# Altium schematic symbol library jlcpcb_2025_04_capacitors_extended_1206.schlib: 2503 symbols (part 6 of 14) (continued)
## CC1206JKNPOCBN471
designator C?  Capacitance: 470pF  (hidden comment: *)
Capacitor, Ceramic (MLCC), 470pF, ±5%, 1kV, NP0, ±5%, SMD 1206; Manufacturer: YAGEO; Manufacturer Part Number: CC1206JKNPOCBN471; Package Size: 1206; JLCPCB Basic Part: No; JLCPCB Part Number: C107177; Supplier 1: LCSC; Category: Capacitors - MLCC; Supplier Part Number 1: C107177; Tolerance: ±5%; Voltage Rating: 1kV; Temperature Coefficient: NP0; RoHS: Yes; ComponentLink1Description: Datasheet; ComponentLink1URL: https://wmsc.lcsc.com/wmsc/upload/file/pdf/v2/lcsc/2304140030_YAGEO-CC1206JKNPOCBN471_C107177.pdf; ComponentLink2Description: JLCPCB Part URL; ComponentLink2URL: https://jlcpcb.com/partdetail/C107177; ComponentLink3Description: LCSC Part URL; ComponentLink3URL: https://lcsc.com/product-detail/Multilayer-Ceramic-Capacitors-MLCC---SMD-SMT_YAGEO-YAGEO-CC1206JKNPOCBN471_C107177.html
footprint CAP-1206 (1206 (3216M) Capacitor)
pins: 1, 2

## CC1206JKNPOCBN560
designator C?  Capacitance: 56pF  (hidden comment: *)
Capacitor, Ceramic (MLCC), 56pF, ±5%, 1kV, NP0, ±5%, SMD 1206; Manufacturer: YAGEO; Manufacturer Part Number: CC1206JKNPOCBN560; Package Size: 1206; JLCPCB Basic Part: No; JLCPCB Part Number: C113875; Supplier 1: LCSC; Category: Capacitors - MLCC; Supplier Part Number 1: C113875; Tolerance: ±5%; Voltage Rating: 1kV; Temperature Coefficient: NP0; RoHS: Yes; ComponentLink1Description: Datasheet; ComponentLink1URL: https://wmsc.lcsc.com/wmsc/upload/file/pdf/v2/lcsc/2304140030_YAGEO-CC1206JKNPOCBN560_C113875.pdf; ComponentLink2Description: JLCPCB Part URL; ComponentLink2URL: https://jlcpcb.com/partdetail/C113875; ComponentLink3Description: LCSC Part URL; ComponentLink3URL: https://lcsc.com/product-detail/Multilayer-Ceramic-Capacitors-MLCC---SMD-SMT_YAGEO-YAGEO-CC1206JKNPOCBN560_C113875.html
footprint CAP-1206 (1206 (3216M) Capacitor)
pins: 1, 2

## CC1206JKNPOCBN561
designator C?  Capacitance: 560pF  (hidden comment: *)
Capacitor, Ceramic (MLCC), 560pF, ±5%, 1kV, NP0, ±5%, SMD 1206; Manufacturer: YAGEO; Manufacturer Part Number: CC1206JKNPOCBN561; Package Size: 1206; JLCPCB Basic Part: No; JLCPCB Part Number: C541496; Supplier 1: LCSC; Category: Capacitors - MLCC; Supplier Part Number 1: C541496; Tolerance: ±5%; Voltage Rating: 1kV; Temperature Coefficient: NP0; RoHS: Yes; ComponentLink1Description: Datasheet; ComponentLink1URL: https://wmsc.lcsc.com/wmsc/upload/file/pdf/v2/lcsc/2006151141_YAGEO-CC1206JKNPOCBN561_C541496.pdf; ComponentLink2Description: JLCPCB Part URL; ComponentLink2URL: https://jlcpcb.com/partdetail/C541496; ComponentLink3Description: LCSC Part URL; ComponentLink3URL: https://lcsc.com/product-detail/Multilayer-Ceramic-Capacitors-MLCC---SMD-SMT_YAGEO-YAGEO-CC1206JKNPOCBN561_C541496.html
footprint CAP-1206 (1206 (3216M) Capacitor)
pins: 1, 2

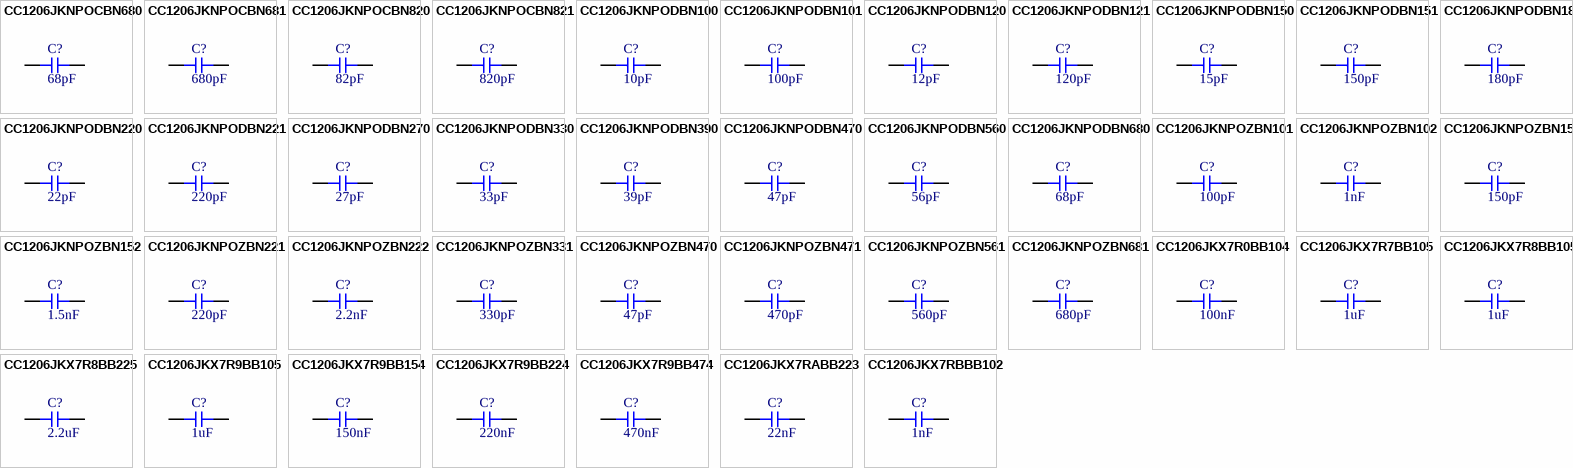
[diagram p25: symbols CC1206JKNPOCBN680 to CC1206JKX7RBBB102]

## CC1206JKNPOCBN680
designator C?  Capacitance: 68pF  (hidden comment: *)
Capacitor, Ceramic (MLCC), 68pF, ±5%, 1kV, NP0, ±5%, SMD 1206; Manufacturer: YAGEO; Manufacturer Part Number: CC1206JKNPOCBN680; Package Size: 1206; JLCPCB Basic Part: No; JLCPCB Part Number: C107178; Supplier 1: LCSC; Category: Capacitors - MLCC; Supplier Part Number 1: C107178; Tolerance: ±5%; Voltage Rating: 1kV; Temperature Coefficient: NP0; RoHS: Yes; ComponentLink1Description: Datasheet; ComponentLink1URL: https://wmsc.lcsc.com/wmsc/upload/file/pdf/v2/lcsc/2304140030_YAGEO-CC1206JKNPOCBN680_C107178.pdf; ComponentLink2Description: JLCPCB Part URL; ComponentLink2URL: https://jlcpcb.com/partdetail/C107178; ComponentLink3Description: LCSC Part URL; ComponentLink3URL: https://lcsc.com/product-detail/Multilayer-Ceramic-Capacitors-MLCC---SMD-SMT_YAGEO-YAGEO-CC1206JKNPOCBN680_C107178.html
footprint CAP-1206 (1206 (3216M) Capacitor)
pins: 1, 2

## CC1206JKNPOCBN681
designator C?  Capacitance: 680pF  (hidden comment: *)
Capacitor, Ceramic (MLCC), 680pF, ±5%, 1kV, NP0, ±5%, SMD 1206; Manufacturer: YAGEO; Manufacturer Part Number: CC1206JKNPOCBN681; Package Size: 1206; JLCPCB Basic Part: No; JLCPCB Part Number: C541497; Supplier 1: LCSC; Category: Capacitors - MLCC; Supplier Part Number 1: C541497; Tolerance: ±5%; Voltage Rating: 1kV; Temperature Coefficient: NP0; RoHS: Yes; ComponentLink1Description: Datasheet; ComponentLink1URL: https://wmsc.lcsc.com/wmsc/upload/file/pdf/v2/lcsc/2006151141_YAGEO-CC1206JKNPOCBN681_C541497.pdf; ComponentLink2Description: JLCPCB Part URL; ComponentLink2URL: https://jlcpcb.com/partdetail/C541497; ComponentLink3Description: LCSC Part URL; ComponentLink3URL: https://lcsc.com/product-detail/Multilayer-Ceramic-Capacitors-MLCC---SMD-SMT_YAGEO-YAGEO-CC1206JKNPOCBN681_C541497.html
footprint CAP-1206 (1206 (3216M) Capacitor)
pins: 1, 2

## CC1206JKNPOCBN820
designator C?  Capacitance: 82pF  (hidden comment: *)
Capacitor, Ceramic (MLCC), 82pF, ±5%, 1kV, NP0, ±5%, SMD 1206; Manufacturer: YAGEO; Manufacturer Part Number: CC1206JKNPOCBN820; Package Size: 1206; JLCPCB Basic Part: No; JLCPCB Part Number: C513610; Supplier 1: LCSC; Category: Capacitors - MLCC; Supplier Part Number 1: C513610; Tolerance: ±5%; Voltage Rating: 1kV; Temperature Coefficient: NP0; RoHS: Yes; ComponentLink1Description: Datasheet; ComponentLink1URL: https://wmsc.lcsc.com/wmsc/upload/file/pdf/v2/lcsc/2005142148_YAGEO-CC1206JKNPOCBN820_C513610.pdf; ComponentLink2Description: JLCPCB Part URL; ComponentLink2URL: https://jlcpcb.com/partdetail/C513610; ComponentLink3Description: LCSC Part URL; ComponentLink3URL: https://lcsc.com/product-detail/Multilayer-Ceramic-Capacitors-MLCC---SMD-SMT_YAGEO-YAGEO-CC1206JKNPOCBN820_C513610.html
footprint CAP-1206 (1206 (3216M) Capacitor)
pins: 1, 2

## CC1206JKNPOCBN821
designator C?  Capacitance: 820pF  (hidden comment: *)
Capacitor, Ceramic (MLCC), 820pF, ±5%, 1kV, NP0, ±5%, SMD 1206; Manufacturer: YAGEO; Manufacturer Part Number: CC1206JKNPOCBN821; Package Size: 1206; JLCPCB Basic Part: No; JLCPCB Part Number: C527262; Supplier 1: LCSC; Category: Capacitors - MLCC; Supplier Part Number 1: C527262; Tolerance: ±5%; Voltage Rating: 1kV; Temperature Coefficient: NP0; RoHS: Yes; ComponentLink1Description: Datasheet; ComponentLink1URL: https://wmsc.lcsc.com/wmsc/upload/file/pdf/v2/lcsc/2005222142_YAGEO-CC1206JKNPOCBN821_C527262.pdf; ComponentLink2Description: JLCPCB Part URL; ComponentLink2URL: https://jlcpcb.com/partdetail/C527262; ComponentLink3Description: LCSC Part URL; ComponentLink3URL: https://lcsc.com/product-detail/Multilayer-Ceramic-Capacitors-MLCC---SMD-SMT_YAGEO-YAGEO-CC1206JKNPOCBN821_C527262.html
footprint CAP-1206 (1206 (3216M) Capacitor)
pins: 1, 2

## CC1206JKNPODBN100
designator C?  Capacitance: 10pF  (hidden comment: *)
Capacitor, Ceramic (MLCC), 10pF, ±5%, 2kV, NP0, ±5%, SMD 1206; Manufacturer: YAGEO; Manufacturer Part Number: CC1206JKNPODBN100; Package Size: 1206; JLCPCB Basic Part: No; JLCPCB Part Number: C272882; Supplier 1: LCSC; Category: Capacitors - MLCC; Supplier Part Number 1: C272882; Tolerance: ±5%; Voltage Rating: 2kV; Temperature Coefficient: NP0; RoHS: Yes; ComponentLink1Description: Datasheet; ComponentLink1URL: https://wmsc.lcsc.com/wmsc/upload/file/pdf/v2/lcsc/2304140030_YAGEO-CC1206JKNPODBN100_C272882.pdf; ComponentLink2Description: JLCPCB Part URL; ComponentLink2URL: https://jlcpcb.com/partdetail/C272882; ComponentLink3Description: LCSC Part URL; ComponentLink3URL: https://lcsc.com/product-detail/Multilayer-Ceramic-Capacitors-MLCC---SMD-SMT_YAGEO-YAGEO-CC1206JKNPODBN100_C272882.html
footprint CAP-1206 (1206 (3216M) Capacitor)
pins: 1, 2

## CC1206JKNPODBN101
designator C?  Capacitance: 100pF  (hidden comment: *)
Capacitor, Ceramic (MLCC), 100pF, ±5%, 2kV, NP0, ±5%, SMD 1206; Manufacturer: YAGEO; Manufacturer Part Number: CC1206JKNPODBN101; Package Size: 1206; JLCPCB Basic Part: No; JLCPCB Part Number: C113876; Supplier 1: LCSC; Category: Capacitors - MLCC; Supplier Part Number 1: C113876; Tolerance: ±5%; Voltage Rating: 2kV; Temperature Coefficient: NP0; RoHS: Yes; ComponentLink1Description: Datasheet; ComponentLink1URL: https://wmsc.lcsc.com/wmsc/upload/file/pdf/v2/lcsc/2304140030_YAGEO-CC1206JKNPODBN101_C113876.pdf; ComponentLink2Description: JLCPCB Part URL; ComponentLink2URL: https://jlcpcb.com/partdetail/C113876; ComponentLink3Description: LCSC Part URL; ComponentLink3URL: https://lcsc.com/product-detail/Multilayer-Ceramic-Capacitors-MLCC---SMD-SMT_YAGEO-YAGEO-CC1206JKNPODBN101_C113876.html
footprint CAP-1206 (1206 (3216M) Capacitor)
pins: 1, 2

## CC1206JKNPODBN120
designator C?  Capacitance: 12pF  (hidden comment: *)
Capacitor, Ceramic (MLCC), 12pF, ±5%, 2kV, NP0, ±5%, SMD 1206; Manufacturer: YAGEO; Manufacturer Part Number: CC1206JKNPODBN120; Package Size: 1206; JLCPCB Basic Part: No; JLCPCB Part Number: C577125; Supplier 1: LCSC; Category: Capacitors - MLCC; Supplier Part Number 1: C577125; Tolerance: ±5%; Voltage Rating: 2kV; Temperature Coefficient: NP0; RoHS: Yes; ComponentLink1Description: Datasheet; ComponentLink1URL: https://wmsc.lcsc.com/wmsc/upload/file/pdf/v2/lcsc/2302141900_YAGEO-CC1206JKNPODBN120_C577125.pdf; ComponentLink2Description: JLCPCB Part URL; ComponentLink2URL: https://jlcpcb.com/partdetail/C577125; ComponentLink3Description: LCSC Part URL; ComponentLink3URL: https://lcsc.com/product-detail/Multilayer-Ceramic-Capacitors-MLCC---SMD-SMT_YAGEO-YAGEO-CC1206JKNPODBN120_C577125.html
footprint CAP-1206 (1206 (3216M) Capacitor)
pins: 1, 2

## CC1206JKNPODBN121
designator C?  Capacitance: 120pF  (hidden comment: *)
Capacitor, Ceramic (MLCC), 120pF, ±5%, 2kV, NP0, ±5%, SMD 1206; Manufacturer: YAGEO; Manufacturer Part Number: CC1206JKNPODBN121; Package Size: 1206; JLCPCB Basic Part: No; JLCPCB Part Number: C527263; Supplier 1: LCSC; Category: Capacitors - MLCC; Supplier Part Number 1: C527263; Tolerance: ±5%; Voltage Rating: 2kV; Temperature Coefficient: NP0; RoHS: Yes; ComponentLink1Description: Datasheet; ComponentLink1URL: https://wmsc.lcsc.com/wmsc/upload/file/pdf/v2/lcsc/2007091834_YAGEO-CC1206JKNPODBN121_C527263.pdf; ComponentLink2Description: JLCPCB Part URL; ComponentLink2URL: https://jlcpcb.com/partdetail/C527263; ComponentLink3Description: LCSC Part URL; ComponentLink3URL: https://lcsc.com/product-detail/Multilayer-Ceramic-Capacitors-MLCC---SMD-SMT_YAGEO-YAGEO-CC1206JKNPODBN121_C527263.html
footprint CAP-1206 (1206 (3216M) Capacitor)
pins: 1, 2

## CC1206JKNPODBN150
designator C?  Capacitance: 15pF  (hidden comment: *)
Capacitor, Ceramic (MLCC), 15pF, ±5%, 2kV, NP0, ±5%, SMD 1206; Manufacturer: YAGEO; Manufacturer Part Number: CC1206JKNPODBN150; Package Size: 1206; JLCPCB Basic Part: No; JLCPCB Part Number: C527264; Supplier 1: LCSC; Category: Capacitors - MLCC; Supplier Part Number 1: C527264; Tolerance: ±5%; Voltage Rating: 2kV; Temperature Coefficient: NP0; RoHS: Yes; ComponentLink1Description: Datasheet; ComponentLink1URL: https://wmsc.lcsc.com/wmsc/upload/file/pdf/v2/lcsc/2008061533_YAGEO-CC1206JKNPODBN150_C527264.pdf; ComponentLink2Description: JLCPCB Part URL; ComponentLink2URL: https://jlcpcb.com/partdetail/C527264; ComponentLink3Description: LCSC Part URL; ComponentLink3URL: https://lcsc.com/product-detail/Multilayer-Ceramic-Capacitors-MLCC---SMD-SMT_YAGEO-YAGEO-CC1206JKNPODBN150_C527264.html
footprint CAP-1206 (1206 (3216M) Capacitor)
pins: 1, 2

## CC1206JKNPODBN151
designator C?  Capacitance: 150pF  (hidden comment: *)
Capacitor, Ceramic (MLCC), 150pF, ±5%, 2kV, NP0, ±5%, SMD 1206; Manufacturer: YAGEO; Manufacturer Part Number: CC1206JKNPODBN151; Package Size: 1206; JLCPCB Basic Part: No; JLCPCB Part Number: C527265; Supplier 1: LCSC; Category: Capacitors - MLCC; Supplier Part Number 1: C527265; Tolerance: ±5%; Voltage Rating: 2kV; Temperature Coefficient: NP0; RoHS: Yes; ComponentLink1Description: Datasheet; ComponentLink1URL: https://wmsc.lcsc.com/wmsc/upload/file/pdf/v2/lcsc/2006031836_YAGEO-CC1206JKNPODBN151_C527265.pdf; ComponentLink2Description: JLCPCB Part URL; ComponentLink2URL: https://jlcpcb.com/partdetail/C527265; ComponentLink3Description: LCSC Part URL; ComponentLink3URL: https://lcsc.com/product-detail/Multilayer-Ceramic-Capacitors-MLCC---SMD-SMT_YAGEO-YAGEO-CC1206JKNPODBN151_C527265.html
footprint CAP-1206 (1206 (3216M) Capacitor)
pins: 1, 2

## CC1206JKNPODBN181
designator C?  Capacitance: 180pF  (hidden comment: *)
Capacitor, Ceramic (MLCC), 180pF, ±5%, 2kV, NP0, ±5%, SMD 1206; Manufacturer: YAGEO; Manufacturer Part Number: CC1206JKNPODBN181; Package Size: 1206; JLCPCB Basic Part: No; JLCPCB Part Number: C527266; Supplier 1: LCSC; Category: Capacitors - MLCC; Supplier Part Number 1: C527266; Tolerance: ±5%; Voltage Rating: 2kV; Temperature Coefficient: NP0; RoHS: Yes; ComponentLink1Description: Datasheet; ComponentLink1URL: https://wmsc.lcsc.com/wmsc/upload/file/pdf/v2/lcsc/2006241834_YAGEO-CC1206JKNPODBN181_C527266.pdf; ComponentLink2Description: JLCPCB Part URL; ComponentLink2URL: https://jlcpcb.com/partdetail/C527266; ComponentLink3Description: LCSC Part URL; ComponentLink3URL: https://lcsc.com/product-detail/Multilayer-Ceramic-Capacitors-MLCC---SMD-SMT_YAGEO-YAGEO-CC1206JKNPODBN181_C527266.html
footprint CAP-1206 (1206 (3216M) Capacitor)
pins: 1, 2

## CC1206JKNPODBN220
designator C?  Capacitance: 22pF  (hidden comment: *)
Capacitor, Ceramic (MLCC), 22pF, ±5%, 2kV, NP0, ±5%, SMD 1206; Manufacturer: YAGEO; Manufacturer Part Number: CC1206JKNPODBN220; Package Size: 1206; JLCPCB Basic Part: No; JLCPCB Part Number: C577126; Supplier 1: LCSC; Category: Capacitors - MLCC; Supplier Part Number 1: C577126; Tolerance: ±5%; Voltage Rating: 2kV; Temperature Coefficient: NP0; RoHS: Yes; ComponentLink1Description: Datasheet; ComponentLink1URL: https://wmsc.lcsc.com/wmsc/upload/file/pdf/v2/lcsc/2202221130_YAGEO-CC1206JKNPODBN220_C577126.pdf; ComponentLink2Description: JLCPCB Part URL; ComponentLink2URL: https://jlcpcb.com/partdetail/C577126; ComponentLink3Description: LCSC Part URL; ComponentLink3URL: https://lcsc.com/product-detail/Multilayer-Ceramic-Capacitors-MLCC---SMD-SMT_YAGEO-YAGEO-CC1206JKNPODBN220_C577126.html
footprint CAP-1206 (1206 (3216M) Capacitor)
pins: 1, 2

## CC1206JKNPODBN221
designator C?  Capacitance: 220pF  (hidden comment: *)
Capacitor, Ceramic (MLCC), 220pF, ±5%, 2kV, NP0, ±5%, SMD 1206; Manufacturer: YAGEO; Manufacturer Part Number: CC1206JKNPODBN221; Package Size: 1206; JLCPCB Basic Part: No; JLCPCB Part Number: C469629; Supplier 1: LCSC; Category: Capacitors - MLCC; Supplier Part Number 1: C469629; Tolerance: ±5%; Voltage Rating: 2kV; Temperature Coefficient: NP0; RoHS: Yes; ComponentLink1Description: Datasheet; ComponentLink1URL: https://wmsc.lcsc.com/wmsc/upload/file/pdf/v2/lcsc/2311211121_YAGEO-CC1206JKNPODBN221_C469629.pdf; ComponentLink2Description: JLCPCB Part URL; ComponentLink2URL: https://jlcpcb.com/partdetail/C469629; ComponentLink3Description: LCSC Part URL; ComponentLink3URL: https://lcsc.com/product-detail/Multilayer-Ceramic-Capacitors-MLCC---SMD-SMT_YAGEO-YAGEO-CC1206JKNPODBN221_C469629.html
footprint CAP-1206 (1206 (3216M) Capacitor)
pins: 1, 2

## CC1206JKNPODBN270
designator C?  Capacitance: 27pF  (hidden comment: *)
Capacitor, Ceramic (MLCC), 27pF, ±5%, 2kV, NP0, ±5%, SMD 1206; Manufacturer: YAGEO; Manufacturer Part Number: CC1206JKNPODBN270; Package Size: 1206; JLCPCB Basic Part: No; JLCPCB Part Number: C577127; Supplier 1: LCSC; Category: Capacitors - MLCC; Supplier Part Number 1: C577127; Tolerance: ±5%; Voltage Rating: 2kV; Temperature Coefficient: NP0; RoHS: Yes; ComponentLink1Description: Datasheet; ComponentLink1URL: https://wmsc.lcsc.com/wmsc/upload/file/pdf/v2/lcsc/2212291709_YAGEO-CC1206JKNPODBN270_C577127.pdf; ComponentLink2Description: JLCPCB Part URL; ComponentLink2URL: https://jlcpcb.com/partdetail/C577127; ComponentLink3Description: LCSC Part URL; ComponentLink3URL: https://lcsc.com/product-detail/Multilayer-Ceramic-Capacitors-MLCC---SMD-SMT_YAGEO-YAGEO-CC1206JKNPODBN270_C577127.html
footprint CAP-1206 (1206 (3216M) Capacitor)
pins: 1, 2

## CC1206JKNPODBN330
designator C?  Capacitance: 33pF  (hidden comment: *)
Capacitor, Ceramic (MLCC), 33pF, ±5%, 2kV, NP0, ±5%, SMD 1206; Manufacturer: YAGEO; Manufacturer Part Number: CC1206JKNPODBN330; Package Size: 1206; JLCPCB Basic Part: No; JLCPCB Part Number: C309497; Supplier 1: LCSC; Category: Capacitors - MLCC; Supplier Part Number 1: C309497; Tolerance: ±5%; Voltage Rating: 2kV; Temperature Coefficient: NP0; RoHS: Yes; ComponentLink1Description: Datasheet; ComponentLink1URL: https://wmsc.lcsc.com/wmsc/upload/file/pdf/v2/lcsc/1912111437_YAGEO-CC1206JKNPODBN330_C309497.pdf; ComponentLink2Description: JLCPCB Part URL; ComponentLink2URL: https://jlcpcb.com/partdetail/C309497; ComponentLink3Description: LCSC Part URL; ComponentLink3URL: https://lcsc.com/product-detail/Multilayer-Ceramic-Capacitors-MLCC---SMD-SMT_YAGEO-YAGEO-CC1206JKNPODBN330_C309497.html
footprint CAP-1206 (1206 (3216M) Capacitor)
pins: 1, 2

## CC1206JKNPODBN390
designator C?  Capacitance: 39pF  (hidden comment: *)
Capacitor, Ceramic (MLCC), 39pF, ±5%, 2kV, NP0, ±5%, SMD 1206; Manufacturer: YAGEO; Manufacturer Part Number: CC1206JKNPODBN390; Package Size: 1206; JLCPCB Basic Part: No; JLCPCB Part Number: C726628; Supplier 1: LCSC; Category: Capacitors - MLCC; Supplier Part Number 1: C726628; Tolerance: ±5%; Voltage Rating: 2kV; Temperature Coefficient: NP0; RoHS: Yes; ComponentLink1Description: Datasheet; ComponentLink1URL: https://wmsc.lcsc.com/wmsc/upload/file/pdf/v2/lcsc/2105241411_YAGEO-CC1206JKNPODBN390_C726628.pdf; ComponentLink2Description: JLCPCB Part URL; ComponentLink2URL: https://jlcpcb.com/partdetail/C726628; ComponentLink3Description: LCSC Part URL; ComponentLink3URL: https://lcsc.com/product-detail/Multilayer-Ceramic-Capacitors-MLCC---SMD-SMT_YAGEO-YAGEO-CC1206JKNPODBN390_C726628.html
footprint CAP-1206 (1206 (3216M) Capacitor)
pins: 1, 2

## CC1206JKNPODBN470
designator C?  Capacitance: 47pF  (hidden comment: *)
Capacitor, Ceramic (MLCC), 47pF, ±5%, 2kV, NP0, ±5%, SMD 1206; Manufacturer: YAGEO; Manufacturer Part Number: CC1206JKNPODBN470; Package Size: 1206; JLCPCB Basic Part: No; JLCPCB Part Number: C577128; Supplier 1: LCSC; Category: Capacitors - MLCC; Supplier Part Number 1: C577128; Tolerance: ±5%; Voltage Rating: 2kV; Temperature Coefficient: NP0; RoHS: Yes; ComponentLink1Description: Datasheet; ComponentLink1URL: https://wmsc.lcsc.com/wmsc/upload/file/pdf/v2/lcsc/2204291416_YAGEO-CC1206JKNPODBN470_C577128.pdf; ComponentLink2Description: JLCPCB Part URL; ComponentLink2URL: https://jlcpcb.com/partdetail/C577128; ComponentLink3Description: LCSC Part URL; ComponentLink3URL: https://lcsc.com/product-detail/Multilayer-Ceramic-Capacitors-MLCC---SMD-SMT_YAGEO-YAGEO-CC1206JKNPODBN470_C577128.html
footprint CAP-1206 (1206 (3216M) Capacitor)
pins: 1, 2

## CC1206JKNPODBN560
designator C?  Capacitance: 56pF  (hidden comment: *)
Capacitor, Ceramic (MLCC), 56pF, ±5%, 2kV, NP0, ±5%, SMD 1206; Manufacturer: YAGEO; Manufacturer Part Number: CC1206JKNPODBN560; Package Size: 1206; JLCPCB Basic Part: No; JLCPCB Part Number: C577129; Supplier 1: LCSC; Category: Capacitors - MLCC; Supplier Part Number 1: C577129; Tolerance: ±5%; Voltage Rating: 2kV; Temperature Coefficient: NP0; RoHS: Yes; ComponentLink1Description: Datasheet; ComponentLink1URL: https://wmsc.lcsc.com/wmsc/upload/file/pdf/v2/lcsc/2311211121_YAGEO-CC1206JKNPODBN560_C577129.pdf; ComponentLink2Description: JLCPCB Part URL; ComponentLink2URL: https://jlcpcb.com/partdetail/C577129; ComponentLink3Description: LCSC Part URL; ComponentLink3URL: https://lcsc.com/product-detail/Multilayer-Ceramic-Capacitors-MLCC---SMD-SMT_YAGEO-YAGEO-CC1206JKNPODBN560_C577129.html
footprint CAP-1206 (1206 (3216M) Capacitor)
pins: 1, 2

## CC1206JKNPODBN680
designator C?  Capacitance: 68pF  (hidden comment: *)
Capacitor, Ceramic (MLCC), 68pF, ±5%, 2kV, NP0, ±5%, SMD 1206; Manufacturer: YAGEO; Manufacturer Part Number: CC1206JKNPODBN680; Package Size: 1206; JLCPCB Basic Part: No; JLCPCB Part Number: C113877; Supplier 1: LCSC; Category: Capacitors - MLCC; Supplier Part Number 1: C113877; Tolerance: ±5%; Voltage Rating: 2kV; Temperature Coefficient: NP0; RoHS: Yes; ComponentLink1Description: Datasheet; ComponentLink1URL: https://wmsc.lcsc.com/wmsc/upload/file/pdf/v2/lcsc/2304140030_YAGEO-CC1206JKNPODBN680_C113877.pdf; ComponentLink2Description: JLCPCB Part URL; ComponentLink2URL: https://jlcpcb.com/partdetail/C113877; ComponentLink3Description: LCSC Part URL; ComponentLink3URL: https://lcsc.com/product-detail/Multilayer-Ceramic-Capacitors-MLCC---SMD-SMT_YAGEO-YAGEO-CC1206JKNPODBN680_C113877.html
footprint CAP-1206 (1206 (3216M) Capacitor)
pins: 1, 2

## CC1206JKNPOZBN101
designator C?  Capacitance: 100pF  (hidden comment: *)
Capacitor, Ceramic (MLCC), 100pF, ±5%, 630V, NP0, ±5%, SMD 1206; Manufacturer: YAGEO; Manufacturer Part Number: CC1206JKNPOZBN101; Package Size: 1206; JLCPCB Basic Part: No; JLCPCB Part Number: C272886; Supplier 1: LCSC; Category: Capacitors - MLCC; Supplier Part Number 1: C272886; Tolerance: ±5%; Voltage Rating: 630V; Temperature Coefficient: NP0; RoHS: Yes; ComponentLink1Description: Datasheet; ComponentLink1URL: https://wmsc.lcsc.com/wmsc/upload/file/pdf/v2/lcsc/2304140030_YAGEO-CC1206JKNPOZBN101_C272886.pdf; ComponentLink2Description: JLCPCB Part URL; ComponentLink2URL: https://jlcpcb.com/partdetail/C272886; ComponentLink3Description: LCSC Part URL; ComponentLink3URL: https://lcsc.com/product-detail/Multilayer-Ceramic-Capacitors-MLCC---SMD-SMT_YAGEO-YAGEO-CC1206JKNPOZBN101_C272886.html
footprint CAP-1206 (1206 (3216M) Capacitor)
pins: 1, 2

## CC1206JKNPOZBN102
designator C?  Capacitance: 1nF  (hidden comment: *)
Capacitor, Ceramic (MLCC), 1nF, ±5%, 630V, NP0, ±5%, SMD 1206; Manufacturer: YAGEO; Manufacturer Part Number: CC1206JKNPOZBN102; Package Size: 1206; JLCPCB Basic Part: No; JLCPCB Part Number: C577131; Supplier 1: LCSC; Category: Capacitors - MLCC; Supplier Part Number 1: C577131; Tolerance: ±5%; Voltage Rating: 630V; Temperature Coefficient: NP0; RoHS: Yes; ComponentLink1Description: Datasheet; ComponentLink1URL: https://wmsc.lcsc.com/wmsc/upload/file/pdf/v2/lcsc/2006091815_YAGEO-CC1206JKNPOZBN102_C577131.pdf; ComponentLink2Description: JLCPCB Part URL; ComponentLink2URL: https://jlcpcb.com/partdetail/C577131; ComponentLink3Description: LCSC Part URL; ComponentLink3URL: https://lcsc.com/product-detail/Multilayer-Ceramic-Capacitors-MLCC---SMD-SMT_YAGEO-YAGEO-CC1206JKNPOZBN102_C577131.html
footprint CAP-1206 (1206 (3216M) Capacitor)
pins: 1, 2

## CC1206JKNPOZBN151
designator C?  Capacitance: 150pF  (hidden comment: *)
Capacitor, Ceramic (MLCC), 150pF, ±5%, 630V, NP0, ±5%, SMD 1206; Manufacturer: YAGEO; Manufacturer Part Number: CC1206JKNPOZBN151; Package Size: 1206; JLCPCB Basic Part: No; JLCPCB Part Number: C527267; Supplier 1: LCSC; Category: Capacitors - MLCC; Supplier Part Number 1: C527267; Tolerance: ±5%; Voltage Rating: 630V; Temperature Coefficient: NP0; RoHS: Yes; ComponentLink1Description: Datasheet; ComponentLink1URL: https://wmsc.lcsc.com/wmsc/upload/file/pdf/v2/lcsc/2005262135_YAGEO-CC1206JKNPOZBN151_C527267.pdf; ComponentLink2Description: JLCPCB Part URL; ComponentLink2URL: https://jlcpcb.com/partdetail/C527267; ComponentLink3Description: LCSC Part URL; ComponentLink3URL: https://lcsc.com/product-detail/Multilayer-Ceramic-Capacitors-MLCC---SMD-SMT_YAGEO-YAGEO-CC1206JKNPOZBN151_C527267.html
footprint CAP-1206 (1206 (3216M) Capacitor)
pins: 1, 2

## CC1206JKNPOZBN152
designator C?  Capacitance: 1.5nF  (hidden comment: *)
Capacitor, Ceramic (MLCC), 1.5nF, ±5%, 630V, NP0, ±5%, SMD 1206; Manufacturer: YAGEO; Manufacturer Part Number: CC1206JKNPOZBN152; Package Size: 1206; JLCPCB Basic Part: No; JLCPCB Part Number: C513634; Supplier 1: LCSC; Category: Capacitors - MLCC; Supplier Part Number 1: C513634; Tolerance: ±5%; Voltage Rating: 630V; Temperature Coefficient: NP0; RoHS: Yes; ComponentLink1Description: Datasheet; ComponentLink1URL: https://wmsc.lcsc.com/wmsc/upload/file/pdf/v2/lcsc/2311211121_YAGEO-CC1206JKNPOZBN152_C513634.pdf; ComponentLink2Description: JLCPCB Part URL; ComponentLink2URL: https://jlcpcb.com/partdetail/C513634; ComponentLink3Description: LCSC Part URL; ComponentLink3URL: https://lcsc.com/product-detail/Multilayer-Ceramic-Capacitors-MLCC---SMD-SMT_YAGEO-YAGEO-CC1206JKNPOZBN152_C513634.html
footprint CAP-1206 (1206 (3216M) Capacitor)
pins: 1, 2

## CC1206JKNPOZBN221
designator C?  Capacitance: 220pF  (hidden comment: *)
Capacitor, Ceramic (MLCC), 220pF, ±5%, 630V, NP0, ±5%, SMD 1206; Manufacturer: YAGEO; Manufacturer Part Number: CC1206JKNPOZBN221; Package Size: 1206; JLCPCB Basic Part: No; JLCPCB Part Number: C527268; Supplier 1: LCSC; Category: Capacitors - MLCC; Supplier Part Number 1: C527268; Tolerance: ±5%; Voltage Rating: 630V; Temperature Coefficient: NP0; RoHS: Yes; ComponentLink1Description: Datasheet; ComponentLink1URL: https://wmsc.lcsc.com/wmsc/upload/file/pdf/v2/lcsc/2005261833_YAGEO-CC1206JKNPOZBN221_C527268.pdf; ComponentLink2Description: JLCPCB Part URL; ComponentLink2URL: https://jlcpcb.com/partdetail/C527268; ComponentLink3Description: LCSC Part URL; ComponentLink3URL: https://lcsc.com/product-detail/Multilayer-Ceramic-Capacitors-MLCC---SMD-SMT_YAGEO-YAGEO-CC1206JKNPOZBN221_C527268.html
footprint CAP-1206 (1206 (3216M) Capacitor)
pins: 1, 2

## CC1206JKNPOZBN222
designator C?  Capacitance: 2.2nF  (hidden comment: *)
Capacitor, Ceramic (MLCC), 2.2nF, ±5%, 630V, NP0, ±5%, SMD 1206; Manufacturer: YAGEO; Manufacturer Part Number: CC1206JKNPOZBN222; Package Size: 1206; JLCPCB Basic Part: No; JLCPCB Part Number: C596322; Supplier 1: LCSC; Category: Capacitors - MLCC; Supplier Part Number 1: C596322; Tolerance: ±5%; Voltage Rating: 630V; Temperature Coefficient: NP0; RoHS: Yes; ComponentLink1Description: Datasheet; ComponentLink1URL: https://wmsc.lcsc.com/wmsc/upload/file/pdf/v2/lcsc/2006091815_YAGEO-CC1206JKNPOZBN222_C596322.pdf; ComponentLink2Description: JLCPCB Part URL; ComponentLink2URL: https://jlcpcb.com/partdetail/C596322; ComponentLink3Description: LCSC Part URL; ComponentLink3URL: https://lcsc.com/product-detail/Multilayer-Ceramic-Capacitors-MLCC---SMD-SMT_YAGEO-YAGEO-CC1206JKNPOZBN222_C596322.html
footprint CAP-1206 (1206 (3216M) Capacitor)
pins: 1, 2

## CC1206JKNPOZBN331
designator C?  Capacitance: 330pF  (hidden comment: *)
Capacitor, Ceramic (MLCC), 330pF, ±5%, 630V, NP0, ±5%, SMD 1206; Manufacturer: YAGEO; Manufacturer Part Number: CC1206JKNPOZBN331; Package Size: 1206; JLCPCB Basic Part: No; JLCPCB Part Number: C527269; Supplier 1: LCSC; Category: Capacitors - MLCC; Supplier Part Number 1: C527269; Tolerance: ±5%; Voltage Rating: 630V; Temperature Coefficient: NP0; RoHS: Yes; ComponentLink1Description: Datasheet; ComponentLink1URL: https://wmsc.lcsc.com/wmsc/upload/file/pdf/v2/lcsc/2006101835_YAGEO-CC1206JKNPOZBN331_C527269.pdf; ComponentLink2Description: JLCPCB Part URL; ComponentLink2URL: https://jlcpcb.com/partdetail/C527269; ComponentLink3Description: LCSC Part URL; ComponentLink3URL: https://lcsc.com/product-detail/Multilayer-Ceramic-Capacitors-MLCC---SMD-SMT_YAGEO-YAGEO-CC1206JKNPOZBN331_C527269.html
footprint CAP-1206 (1206 (3216M) Capacitor)
pins: 1, 2

## CC1206JKNPOZBN470
designator C?  Capacitance: 47pF  (hidden comment: *)
Capacitor, Ceramic (MLCC), 47pF, ±5%, 630V, NP0, ±5%, SMD 1206; Manufacturer: YAGEO; Manufacturer Part Number: CC1206JKNPOZBN470; Package Size: 1206; JLCPCB Basic Part: No; JLCPCB Part Number: C577140; Supplier 1: LCSC; Category: Capacitors - MLCC; Supplier Part Number 1: C577140; Tolerance: ±5%; Voltage Rating: 630V; Temperature Coefficient: NP0; RoHS: Yes; ComponentLink1Description: Datasheet; ComponentLink1URL: https://wmsc.lcsc.com/wmsc/upload/file/pdf/v2/lcsc/2208251800_YAGEO-CC1206JKNPOZBN470_C577140.pdf; ComponentLink2Description: JLCPCB Part URL; ComponentLink2URL: https://jlcpcb.com/partdetail/C577140; ComponentLink3Description: LCSC Part URL; ComponentLink3URL: https://lcsc.com/product-detail/Multilayer-Ceramic-Capacitors-MLCC---SMD-SMT_YAGEO-YAGEO-CC1206JKNPOZBN470_C577140.html
footprint CAP-1206 (1206 (3216M) Capacitor)
pins: 1, 2

## CC1206JKNPOZBN471
designator C?  Capacitance: 470pF  (hidden comment: *)
Capacitor, Ceramic (MLCC), 470pF, ±5%, 630V, NP0, ±5%, SMD 1206; Manufacturer: YAGEO; Manufacturer Part Number: CC1206JKNPOZBN471; Package Size: 1206; JLCPCB Basic Part: No; JLCPCB Part Number: C309498; Supplier 1: LCSC; Category: Capacitors - MLCC; Supplier Part Number 1: C309498; Tolerance: ±5%; Voltage Rating: 630V; Temperature Coefficient: NP0; RoHS: Yes; ComponentLink1Description: Datasheet; ComponentLink1URL: https://wmsc.lcsc.com/wmsc/upload/file/pdf/v2/lcsc/2304140030_YAGEO-CC1206JKNPOZBN471_C309498.pdf; ComponentLink2Description: JLCPCB Part URL; ComponentLink2URL: https://jlcpcb.com/partdetail/C309498; ComponentLink3Description: LCSC Part URL; ComponentLink3URL: https://lcsc.com/product-detail/Multilayer-Ceramic-Capacitors-MLCC---SMD-SMT_YAGEO-YAGEO-CC1206JKNPOZBN471_C309498.html
footprint CAP-1206 (1206 (3216M) Capacitor)
pins: 1, 2

## CC1206JKNPOZBN561
designator C?  Capacitance: 560pF  (hidden comment: *)
Capacitor, Ceramic (MLCC), 560pF, ±5%, 630V, NP0, ±5%, SMD 1206; Manufacturer: YAGEO; Manufacturer Part Number: CC1206JKNPOZBN561; Package Size: 1206; JLCPCB Basic Part: No; JLCPCB Part Number: C527270; Supplier 1: LCSC; Category: Capacitors - MLCC; Supplier Part Number 1: C527270; Tolerance: ±5%; Voltage Rating: 630V; Temperature Coefficient: NP0; RoHS: Yes; ComponentLink1Description: Datasheet; ComponentLink1URL: https://wmsc.lcsc.com/wmsc/upload/file/pdf/v2/lcsc/2006031836_YAGEO-CC1206JKNPOZBN561_C527270.pdf; ComponentLink2Description: JLCPCB Part URL; ComponentLink2URL: https://jlcpcb.com/partdetail/C527270; ComponentLink3Description: LCSC Part URL; ComponentLink3URL: https://lcsc.com/product-detail/Multilayer-Ceramic-Capacitors-MLCC---SMD-SMT_YAGEO-YAGEO-CC1206JKNPOZBN561_C527270.html
footprint CAP-1206 (1206 (3216M) Capacitor)
pins: 1, 2

## CC1206JKNPOZBN681
designator C?  Capacitance: 680pF  (hidden comment: *)
Capacitor, Ceramic (MLCC), 680pF, ±5%, 630V, NP0, ±5%, SMD 1206; Manufacturer: YAGEO; Manufacturer Part Number: CC1206JKNPOZBN681; Package Size: 1206; JLCPCB Basic Part: No; JLCPCB Part Number: C527271; Supplier 1: LCSC; Category: Capacitors - MLCC; Supplier Part Number 1: C527271; Tolerance: ±5%; Voltage Rating: 630V; Temperature Coefficient: NP0; RoHS: Yes; ComponentLink1Description: Datasheet; ComponentLink1URL: https://wmsc.lcsc.com/wmsc/upload/file/pdf/v2/lcsc/2006101835_YAGEO-CC1206JKNPOZBN681_C527271.pdf; ComponentLink2Description: JLCPCB Part URL; ComponentLink2URL: https://jlcpcb.com/partdetail/C527271; ComponentLink3Description: LCSC Part URL; ComponentLink3URL: https://lcsc.com/product-detail/Multilayer-Ceramic-Capacitors-MLCC---SMD-SMT_YAGEO-YAGEO-CC1206JKNPOZBN681_C527271.html
footprint CAP-1206 (1206 (3216M) Capacitor)
pins: 1, 2

## CC1206JKX7R0BB104
designator C?  Capacitance: 100nF  (hidden comment: *)
Capacitor, Ceramic (MLCC), 100nF, ±5%, 100V, X7R, ±5%, SMD 1206; Manufacturer: YAGEO; Manufacturer Part Number: CC1206JKX7R0BB104; Package Size: 1206; JLCPCB Basic Part: No; JLCPCB Part Number: C726629; Supplier 1: LCSC; Category: Capacitors - MLCC; Supplier Part Number 1: C726629; Tolerance: ±5%; Voltage Rating: 100V; Temperature Coefficient: X7R; RoHS: Yes; ComponentLink1Description: Datasheet; ComponentLink1URL: https://wmsc.lcsc.com/wmsc/upload/file/pdf/v2/lcsc/2009181007_YAGEO-CC1206JKX7R0BB104_C726629.pdf; ComponentLink2Description: JLCPCB Part URL; ComponentLink2URL: https://jlcpcb.com/partdetail/C726629; ComponentLink3Description: LCSC Part URL; ComponentLink3URL: https://lcsc.com/product-detail/Multilayer-Ceramic-Capacitors-MLCC---SMD-SMT_YAGEO-YAGEO-CC1206JKX7R0BB104_C726629.html
footprint CAP-1206 (1206 (3216M) Capacitor)
pins: 1, 2

## CC1206JKX7R7BB105
designator C?  Capacitance: 1uF  (hidden comment: *)
Capacitor, Ceramic (MLCC), 1uF, ±5%, 16V, X7R, ±5%, SMD 1206; Manufacturer: YAGEO; Manufacturer Part Number: CC1206JKX7R7BB105; Package Size: 1206; JLCPCB Basic Part: No; JLCPCB Part Number: C527272; Supplier 1: LCSC; Category: Capacitors - MLCC; Supplier Part Number 1: C527272; Tolerance: ±5%; Voltage Rating: 16V; Temperature Coefficient: X7R; RoHS: Yes; ComponentLink1Description: Datasheet; ComponentLink1URL: https://wmsc.lcsc.com/wmsc/upload/file/pdf/v2/lcsc/2005262135_YAGEO-CC1206JKX7R7BB105_C527272.pdf; ComponentLink2Description: JLCPCB Part URL; ComponentLink2URL: https://jlcpcb.com/partdetail/C527272; ComponentLink3Description: LCSC Part URL; ComponentLink3URL: https://lcsc.com/product-detail/Multilayer-Ceramic-Capacitors-MLCC---SMD-SMT_YAGEO-YAGEO-CC1206JKX7R7BB105_C527272.html
footprint CAP-1206 (1206 (3216M) Capacitor)
pins: 1, 2

## CC1206JKX7R8BB105
designator C?  Capacitance: 1uF  (hidden comment: *)
Capacitor, Ceramic (MLCC), 1uF, ±5%, 25V, X7R, ±5%, SMD 1206; Manufacturer: YAGEO; Manufacturer Part Number: CC1206JKX7R8BB105; Package Size: 1206; JLCPCB Basic Part: No; JLCPCB Part Number: C541550; Supplier 1: LCSC; Category: Capacitors - MLCC; Supplier Part Number 1: C541550; Tolerance: ±5%; Voltage Rating: 25V; Temperature Coefficient: X7R; RoHS: Yes; ComponentLink1Description: Datasheet; ComponentLink1URL: https://wmsc.lcsc.com/wmsc/upload/file/pdf/v2/lcsc/2006151144_YAGEO-CC1206JKX7R8BB105_C541550.pdf; ComponentLink2Description: JLCPCB Part URL; ComponentLink2URL: https://jlcpcb.com/partdetail/C541550; ComponentLink3Description: LCSC Part URL; ComponentLink3URL: https://lcsc.com/product-detail/Multilayer-Ceramic-Capacitors-MLCC---SMD-SMT_YAGEO-YAGEO-CC1206JKX7R8BB105_C541550.html
footprint CAP-1206 (1206 (3216M) Capacitor)
pins: 1, 2

## CC1206JKX7R8BB225
designator C?  Capacitance: 2.2uF  (hidden comment: *)
Capacitor, Ceramic (MLCC), 2.2uF, ±5%, 25V, X7R, ±5%, SMD 1206; Manufacturer: YAGEO; Manufacturer Part Number: CC1206JKX7R8BB225; Package Size: 1206; JLCPCB Basic Part: No; JLCPCB Part Number: C577143; Supplier 1: LCSC; Category: Capacitors - MLCC; Supplier Part Number 1: C577143; Tolerance: ±5%; Voltage Rating: 25V; Temperature Coefficient: X7R; RoHS: Yes; ComponentLink1Description: Datasheet; ComponentLink1URL: https://wmsc.lcsc.com/wmsc/upload/file/pdf/v2/lcsc/2302141900_YAGEO-CC1206JKX7R8BB225_C577143.pdf; ComponentLink2Description: JLCPCB Part URL; ComponentLink2URL: https://jlcpcb.com/partdetail/C577143; ComponentLink3Description: LCSC Part URL; ComponentLink3URL: https://lcsc.com/product-detail/Multilayer-Ceramic-Capacitors-MLCC---SMD-SMT_YAGEO-YAGEO-CC1206JKX7R8BB225_C577143.html
footprint CAP-1206 (1206 (3216M) Capacitor)
pins: 1, 2

## CC1206JKX7R9BB105
designator C?  Capacitance: 1uF  (hidden comment: *)
Capacitor, Ceramic (MLCC), 1uF, ±5%, 50V, X7R, ±5%, SMD 1206; Manufacturer: YAGEO; Manufacturer Part Number: CC1206JKX7R9BB105; Package Size: 1206; JLCPCB Basic Part: No; JLCPCB Part Number: C527273; Supplier 1: LCSC; Category: Capacitors - MLCC; Supplier Part Number 1: C527273; Tolerance: ±5%; Voltage Rating: 50V; Temperature Coefficient: X7R; RoHS: Yes; ComponentLink1Description: Datasheet; ComponentLink1URL: https://wmsc.lcsc.com/wmsc/upload/file/pdf/v2/lcsc/2006031836_YAGEO-CC1206JKX7R9BB105_C527273.pdf; ComponentLink2Description: JLCPCB Part URL; ComponentLink2URL: https://jlcpcb.com/partdetail/C527273; ComponentLink3Description: LCSC Part URL; ComponentLink3URL: https://lcsc.com/product-detail/Multilayer-Ceramic-Capacitors-MLCC---SMD-SMT_YAGEO-YAGEO-CC1206JKX7R9BB105_C527273.html
footprint CAP-1206 (1206 (3216M) Capacitor)
pins: 1, 2

## CC1206JKX7R9BB154
designator C?  Capacitance: 150nF  (hidden comment: *)
Capacitor, Ceramic (MLCC), 150nF, ±5%, 50V, X7R, ±5%, SMD 1206; Manufacturer: YAGEO; Manufacturer Part Number: CC1206JKX7R9BB154; Package Size: 1206; JLCPCB Basic Part: No; JLCPCB Part Number: C2171172; Supplier 1: LCSC; Category: Capacitors - MLCC; Supplier Part Number 1: C2171172; Tolerance: ±5%; Voltage Rating: 50V; Temperature Coefficient: X7R; RoHS: Yes; ComponentLink1Description: Datasheet; ComponentLink1URL: https://wmsc.lcsc.com/wmsc/upload/file/pdf/v2/lcsc/2202040500_YAGEO-CC1206JKX7R9BB154_C2171172.pdf; ComponentLink2Description: JLCPCB Part URL; ComponentLink2URL: https://jlcpcb.com/partdetail/C2171172; ComponentLink3Description: LCSC Part URL; ComponentLink3URL: https://lcsc.com/product-detail/Multilayer-Ceramic-Capacitors-MLCC---SMD-SMT_YAGEO-YAGEO-CC1206JKX7R9BB154_C2171172.html
footprint CAP-1206 (1206 (3216M) Capacitor)
pins: 1, 2

## CC1206JKX7R9BB224
designator C?  Capacitance: 220nF  (hidden comment: *)
Capacitor, Ceramic (MLCC), 220nF, ±5%, 50V, X7R, ±5%, SMD 1206; Manufacturer: YAGEO; Manufacturer Part Number: CC1206JKX7R9BB224; Package Size: 1206; JLCPCB Basic Part: No; JLCPCB Part Number: C527274; Supplier 1: LCSC; Category: Capacitors - MLCC; Supplier Part Number 1: C527274; Tolerance: ±5%; Voltage Rating: 50V; Temperature Coefficient: X7R; RoHS: Yes; ComponentLink1Description: Datasheet; ComponentLink1URL: https://wmsc.lcsc.com/wmsc/upload/file/pdf/v2/lcsc/2009180903_YAGEO-CC1206JKX7R9BB224_C527274.pdf; ComponentLink2Description: JLCPCB Part URL; ComponentLink2URL: https://jlcpcb.com/partdetail/C527274; ComponentLink3Description: LCSC Part URL; ComponentLink3URL: https://lcsc.com/product-detail/Multilayer-Ceramic-Capacitors-MLCC---SMD-SMT_YAGEO-YAGEO-CC1206JKX7R9BB224_C527274.html
footprint CAP-1206 (1206 (3216M) Capacitor)
pins: 1, 2

## CC1206JKX7R9BB474
designator C?  Capacitance: 470nF  (hidden comment: *)
Capacitor, Ceramic (MLCC), 470nF, ±5%, 50V, X7R, ±5%, SMD 1206; Manufacturer: YAGEO; Manufacturer Part Number: CC1206JKX7R9BB474; Package Size: 1206; JLCPCB Basic Part: No; JLCPCB Part Number: C541549; Supplier 1: LCSC; Category: Capacitors - MLCC; Supplier Part Number 1: C541549; Tolerance: ±5%; Voltage Rating: 50V; Temperature Coefficient: X7R; RoHS: Yes; ComponentLink1Description: Datasheet; ComponentLink1URL: https://wmsc.lcsc.com/wmsc/upload/file/pdf/v2/lcsc/2006151144_YAGEO-CC1206JKX7R9BB474_C541549.pdf; ComponentLink2Description: JLCPCB Part URL; ComponentLink2URL: https://jlcpcb.com/partdetail/C541549; ComponentLink3Description: LCSC Part URL; ComponentLink3URL: https://lcsc.com/product-detail/Multilayer-Ceramic-Capacitors-MLCC---SMD-SMT_YAGEO-YAGEO-CC1206JKX7R9BB474_C541549.html
footprint CAP-1206 (1206 (3216M) Capacitor)
pins: 1, 2

## CC1206JKX7RABB223
designator C?  Capacitance: 22nF  (hidden comment: *)
Capacitor, Ceramic (MLCC), 22nF, ±5%, 200V, X7R, ±5%, SMD 1206; Manufacturer: YAGEO; Manufacturer Part Number: CC1206JKX7RABB223; Package Size: 1206; JLCPCB Basic Part: No; JLCPCB Part Number: C577144; Supplier 1: LCSC; Category: Capacitors - MLCC; Supplier Part Number 1: C577144; Tolerance: ±5%; Voltage Rating: 200V; Temperature Coefficient: X7R; RoHS: Yes; ComponentLink1Description: Datasheet; ComponentLink1URL: https://wmsc.lcsc.com/wmsc/upload/file/pdf/v2/lcsc/2011301940_YAGEO-CC1206JKX7RABB223_C577144.pdf; ComponentLink2Description: JLCPCB Part URL; ComponentLink2URL: https://jlcpcb.com/partdetail/C577144; ComponentLink3Description: LCSC Part URL; ComponentLink3URL: https://lcsc.com/product-detail/Multilayer-Ceramic-Capacitors-MLCC---SMD-SMT_YAGEO-YAGEO-CC1206JKX7RABB223_C577144.html
footprint CAP-1206 (1206 (3216M) Capacitor)
pins: 1, 2

## CC1206JKX7RBBB102
designator C?  Capacitance: 1nF  (hidden comment: *)
Capacitor, Ceramic (MLCC), 1nF, ±5%, 500V, X7R, ±5%, SMD 1206; Manufacturer: YAGEO; Manufacturer Part Number: CC1206JKX7RBBB102; Package Size: 1206; JLCPCB Basic Part: No; JLCPCB Part Number: C577145; Supplier 1: LCSC; Category: Capacitors - MLCC; Supplier Part Number 1: C577145; Tolerance: ±5%; Voltage Rating: 500V; Temperature Coefficient: X7R; RoHS: Yes; ComponentLink1Description: Datasheet; ComponentLink1URL: https://wmsc.lcsc.com/wmsc/upload/file/pdf/v2/lcsc/2304140030_YAGEO-CC1206JKX7RBBB102_C577145.pdf; ComponentLink2Description: JLCPCB Part URL; ComponentLink2URL: https://jlcpcb.com/partdetail/C577145; ComponentLink3Description: LCSC Part URL; ComponentLink3URL: https://lcsc.com/product-detail/Multilayer-Ceramic-Capacitors-MLCC---SMD-SMT_YAGEO-YAGEO-CC1206JKX7RBBB102_C577145.html
footprint CAP-1206 (1206 (3216M) Capacitor)
pins: 1, 2

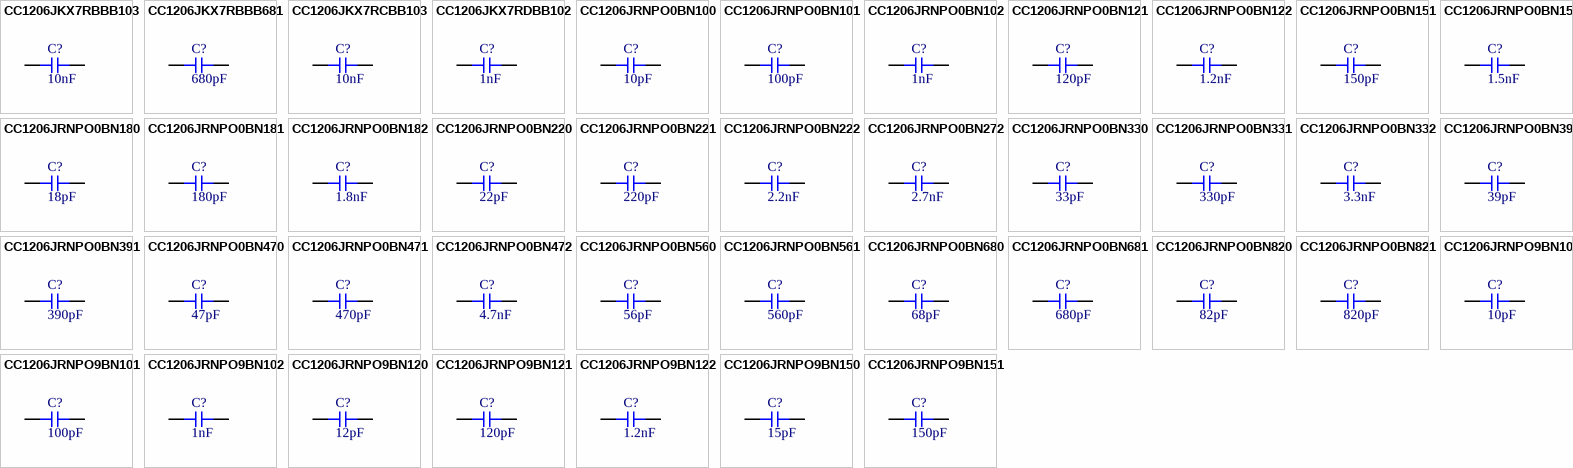
[diagram p26: symbols CC1206JKX7RBBB103 to CC1206JRNPO9BN151]

## CC1206JKX7RBBB103
designator C?  Capacitance: 10nF  (hidden comment: *)
Capacitor, Ceramic (MLCC), 10nF, ±5%, 500V, X7R, ±5%, SMD 1206; Manufacturer: YAGEO; Manufacturer Part Number: CC1206JKX7RBBB103; Package Size: 1206; JLCPCB Basic Part: No; JLCPCB Part Number: C527275; Supplier 1: LCSC; Category: Capacitors - MLCC; Supplier Part Number 1: C527275; Tolerance: ±5%; Voltage Rating: 500V; Temperature Coefficient: X7R; RoHS: Yes; ComponentLink1Description: Datasheet; ComponentLink1URL: https://wmsc.lcsc.com/wmsc/upload/file/pdf/v2/lcsc/2007021837_YAGEO-CC1206JKX7RBBB103_C527275.pdf; ComponentLink2Description: JLCPCB Part URL; ComponentLink2URL: https://jlcpcb.com/partdetail/C527275; ComponentLink3Description: LCSC Part URL; ComponentLink3URL: https://lcsc.com/product-detail/Multilayer-Ceramic-Capacitors-MLCC---SMD-SMT_YAGEO-YAGEO-CC1206JKX7RBBB103_C527275.html
footprint CAP-1206 (1206 (3216M) Capacitor)
pins: 1, 2

## CC1206JKX7RBBB681
designator C?  Capacitance: 680pF  (hidden comment: *)
Capacitor, Ceramic (MLCC), 680pF, ±5%, 500V, X7R, ±5%, SMD 1206; Manufacturer: YAGEO; Manufacturer Part Number: CC1206JKX7RBBB681; Package Size: 1206; JLCPCB Basic Part: No; JLCPCB Part Number: C527276; Supplier 1: LCSC; Category: Capacitors - MLCC; Supplier Part Number 1: C527276; Tolerance: ±5%; Voltage Rating: 500V; Temperature Coefficient: X7R; RoHS: Yes; ComponentLink1Description: Datasheet; ComponentLink1URL: https://wmsc.lcsc.com/wmsc/upload/file/pdf/v2/lcsc/2006241834_YAGEO-CC1206JKX7RBBB681_C527276.pdf; ComponentLink2Description: JLCPCB Part URL; ComponentLink2URL: https://jlcpcb.com/partdetail/C527276; ComponentLink3Description: LCSC Part URL; ComponentLink3URL: https://lcsc.com/product-detail/Multilayer-Ceramic-Capacitors-MLCC---SMD-SMT_YAGEO-YAGEO-CC1206JKX7RBBB681_C527276.html
footprint CAP-1206 (1206 (3216M) Capacitor)
pins: 1, 2

## CC1206JKX7RCBB103
designator C?  Capacitance: 10nF  (hidden comment: *)
Capacitor, Ceramic (MLCC), 10nF, ±5%, 1kV, X7R, ±5%, SMD 1206; Manufacturer: YAGEO; Manufacturer Part Number: CC1206JKX7RCBB103; Package Size: 1206; JLCPCB Basic Part: No; JLCPCB Part Number: C1854329; Supplier 1: LCSC; Category: Capacitors - MLCC; Supplier Part Number 1: C1854329; Tolerance: ±5%; Voltage Rating: 1kV; Temperature Coefficient: X7R; RoHS: Yes; ComponentLink1Description: Datasheet; ComponentLink1URL: https://wmsc.lcsc.com/wmsc/upload/file/pdf/v2/lcsc/2108030230_YAGEO-CC1206JKX7RCBB103_C1854329.pdf; ComponentLink2Description: JLCPCB Part URL; ComponentLink2URL: https://jlcpcb.com/partdetail/C1854329; ComponentLink3Description: LCSC Part URL; ComponentLink3URL: https://lcsc.com/product-detail/Multilayer-Ceramic-Capacitors-MLCC---SMD-SMT_YAGEO-YAGEO-CC1206JKX7RCBB103_C1854329.html
footprint CAP-1206 (1206 (3216M) Capacitor)
pins: 1, 2

## CC1206JKX7RDBB102
designator C?  Capacitance: 1nF  (hidden comment: *)
Capacitor, Ceramic (MLCC), 1nF, ±5%, 2kV, X7R, ±5%, SMD 1206; Manufacturer: YAGEO; Manufacturer Part Number: CC1206JKX7RDBB102; Package Size: 1206; JLCPCB Basic Part: No; JLCPCB Part Number: C541498; Supplier 1: LCSC; Category: Capacitors - MLCC; Supplier Part Number 1: C541498; Tolerance: ±5%; Voltage Rating: 2kV; Temperature Coefficient: X7R; RoHS: Yes; ComponentLink1Description: Datasheet; ComponentLink1URL: https://wmsc.lcsc.com/wmsc/upload/file/pdf/v2/lcsc/2006151141_YAGEO-CC1206JKX7RDBB102_C541498.pdf; ComponentLink2Description: JLCPCB Part URL; ComponentLink2URL: https://jlcpcb.com/partdetail/C541498; ComponentLink3Description: LCSC Part URL; ComponentLink3URL: https://lcsc.com/product-detail/Multilayer-Ceramic-Capacitors-MLCC---SMD-SMT_YAGEO-YAGEO-CC1206JKX7RDBB102_C541498.html
footprint CAP-1206 (1206 (3216M) Capacitor)
pins: 1, 2
